# Altium footprint library Connectors.PcbLib: 46 footprints (part 2 of 3)
Each footprint in its own frame and in the unit in brackets; x right, y up, seen from the top. Pads: shape width x height; smd on the part's side, far side on the other; paste and mask are expansions set on the pad; w line width, h text height; cw(c..) or ccw(c..) is an arc to the next point about the centre after c.
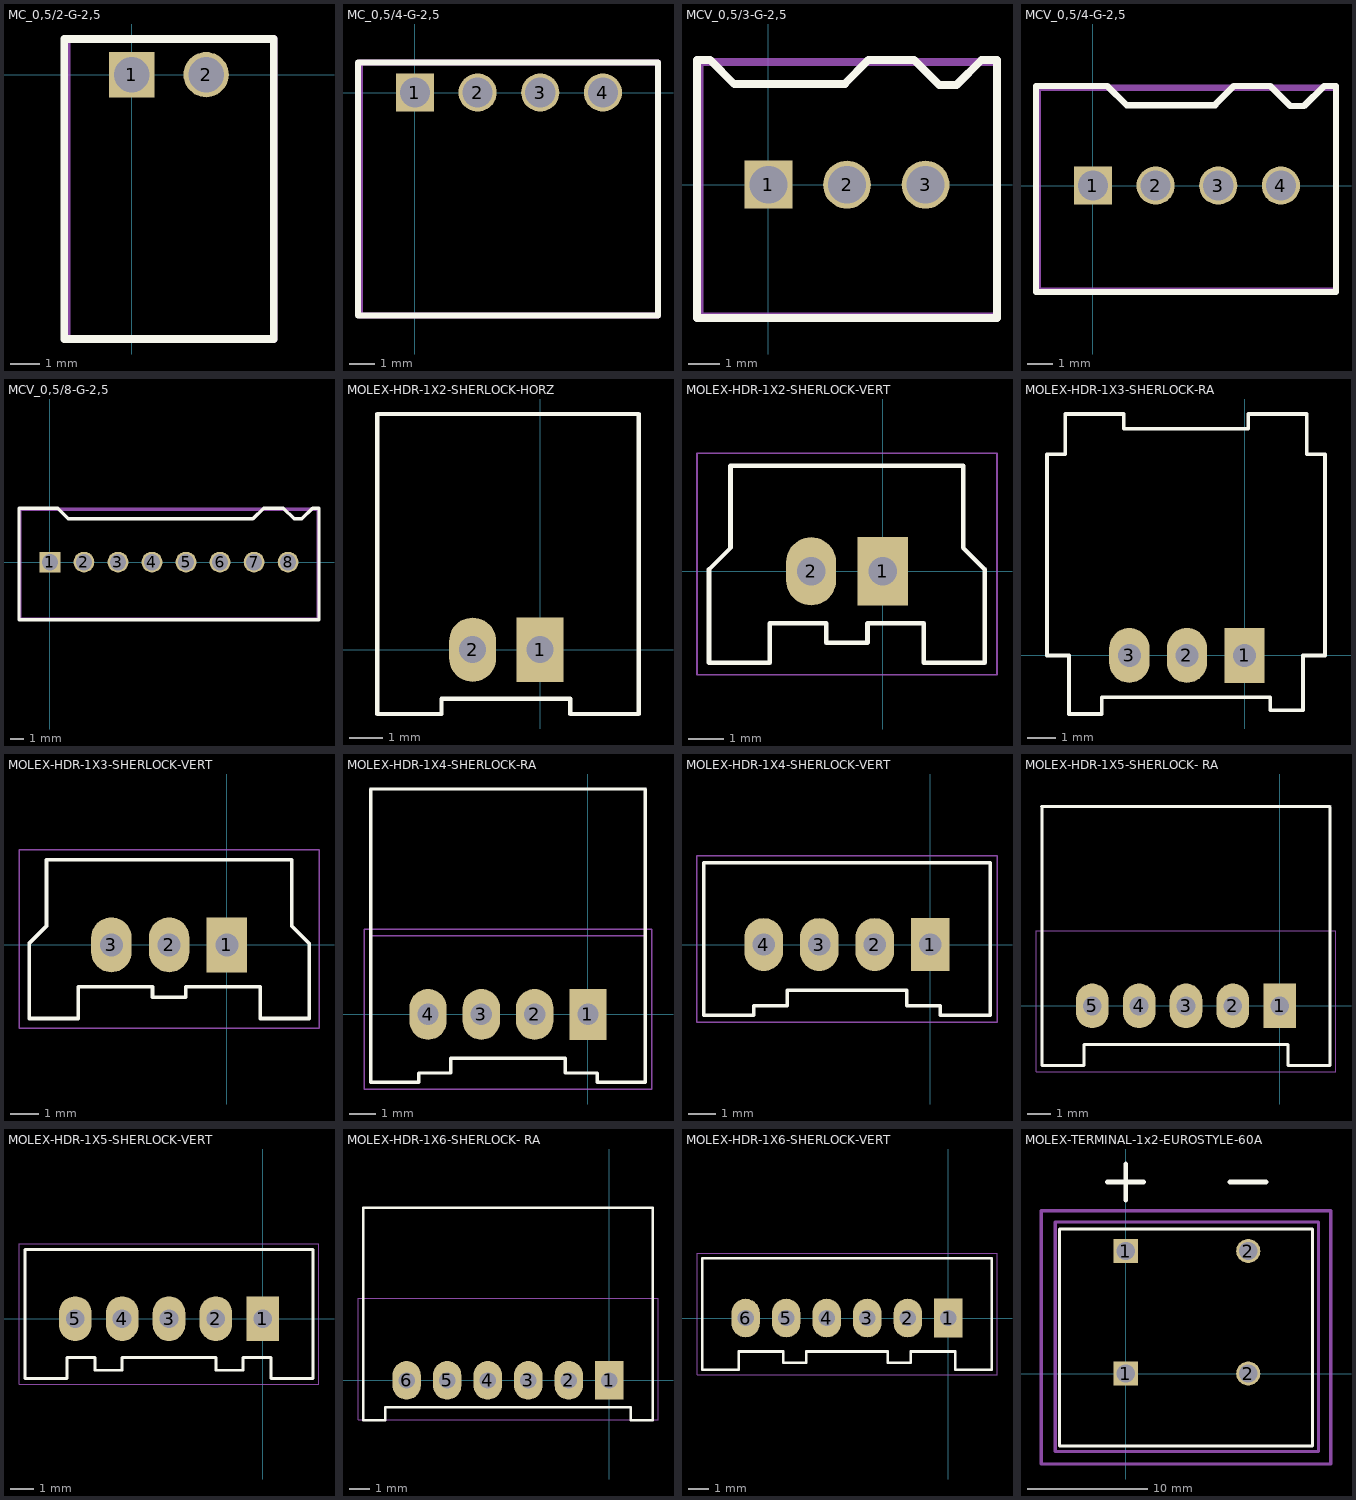
[diagram p1: the footprints below, top view; thin cyan lines are the x and y axes]

## MC_0,5/2-G-2,5 [mil] "CONN TERM BLOCK 2.50MM 2POS RIGHT ANGLE"
pads (2):
  rect 60x60 hole 47.24: 1(0,0)
  round 60 hole 47.24: 2(98.43,0)
Top Overlay:
  lines w10: -89.57,-350.39 187.99,-350.39 187.99,47.24 -89.57,47.24 -89.57,-350.39
Mechanical 13:
  lines w10: -86.61,-350.39 187.99,-350.39 187.99,47.24 -86.61,47.24 -86.61,-350.39
Mechanical 15:
  lines w10: -86.61,-350.39 -86.61,47.24 187.99,47.24 187.99,-350.39 -86.61,-350.39
3D body "1881448_00.stp": height 318.9, standoff -137.8, extent -87,-349.82 184.65,47.82

## MC_0,5/4-G-2,5 [mil] "CONN TERM BLOCK 2.50MM 4POS RIGHT ANGLE"
pads (4):
  rect 60x60 hole 47.24: 1(0,0)
  round 60 hole 47.24: 2(98.43,0) 3(196.85,0) 4(295.27,0)
Top Overlay:
  lines w10: -89.57,-350.39 -89.57,47.24 381.89,47.24 381.89,-350.39 -89.57,-350.39
Mechanical 13:
  lines w10: -86.61,-350.39 -86.61,47.24 381.89,47.24 381.89,-350.39 -86.61,-350.39
Mechanical 15:
  lines w10: -86.61,-350.39 381.89,-350.39 381.89,47.24 -86.61,47.24 -86.61,-350.39
3D body "1881464.stp": height 137.8, standoff -318.9, extent -87.25,-349.64 381.25,48

## MCV_0,5/3-G-2,5 [mil] "CONN TERM BLOCK 2.50MM 3POS"
pads (3):
  rect 60x60 hole 47.24: 1(0,0)
  round 60 hole 47.24: 2(98.43,0) 3(196.85,0)
Top Overlay:
  lines w10: 94.94,125.98 125.46,156.5 182.54,156.5 214.04,125 235.69,125 267.19,156.5 285.89,156.5 ; 95.93,125.98 -42.85,125.98 -73.36,156.5 -89.57,156.5 -89.57,-167.32 286.42,-167.32 286.42,156.5
Mechanical 13:
  lines w10: -86.61,-165.35 -86.61,153.54 286.42,153.54 286.42,-165.35 -86.61,-165.35
Mechanical 15:
  lines w10: 286.42,-165.35 -86.61,-165.35 -86.61,153.54 286.42,153.54 ; 286.42,-164.37 286.42,154.53
3D body "1881561.stp": height 397.64, standoff -137.8, extent -87.04,-165 283.04,153.9

## MCV_0,5/4-G-2,5 [mil] "CONN TERM BLOCK 2.50MM 4POS"
pads (4):
  rect 60x60 hole 47.24: 1(0,0)
  round 60 hole 47.24: 2(98.43,0) 3(196.85,0) 4(295.28,0)
Top Overlay:
  lines w10: 190.94,125.98 221.46,156.5 278.54,156.5 310.04,125 331.69,125 363.19,156.5 381.89,156.5 381.89,-167.32 -89.57,-167.32 -89.57,156.5 22.64,156.5 53.15,125.98 191.93,125.98
Mechanical 13:
  lines w10: -86.61,-165.35 381.89,-165.35 381.89,153.54 -86.61,153.54 -86.61,-165.35
Mechanical 15:
  lines w10: 381.89,-165.35 -86.61,-165.35 -86.61,153.54 381.89,153.54 ; 381.89,-164.37 381.89,154.53
3D body "1881574.stp": height 397.64, standoff -137.8, extent -86.61,-165.35 381.89,153.54

## MCV_0,5/8-G-2,5 [mil] "CONN TERM BLOCK 2.50MM 8POS"
pads (8):
  rect 60x60 hole 47.24: 1(0,0)
  round 60 hole 47.24: 2(98.43,0) 3(196.85,0) 4(295.28,0) 5(393.7,0) 6(492.13,0) 7(590.55,0) 8(688.98,0)
Top Overlay:
  lines w10: -89.57,-167.32 -89.57,156.5 22.64,156.5 53.15,125.98 587.6,125.98 618.11,156.5 675.2,156.5 706.69,125 728.35,125 759.84,156.5 778.54,156.5 778.54,-167.32 -89.57,-167.32
Mechanical 13:
  lines w10: -86.61,-165.35 -86.61,153.54 775.59,153.54 775.59,-165.35 -86.61,-165.35
Mechanical 15:
  lines w10: -86.61,-165.35 775.59,-165.35 775.59,153.54 -86.61,153.54 -86.61,-165.35
3D body "1881613.stp": height 397.64, standoff -137.8, extent -86.61,-165.35 775.59,153.54

## MOLEX-HDR-1X2-SHERLOCK-HORZ [mm]
height 8.5
pads (2):
  rect 1.397x1.905 hole 0.8: 1(0,0)
  oval 1.397x1.905 hole 0.8: 2(-2,0)
Top Overlay:
  lines w0.127: -4.826,-1.905 -2.921,-1.905 -2.921,-1.45 -1.575,-1.45 -0.425,-1.45 0.889,-1.45 0.889,-1.905 2.921,-1.905 2.921,-0.021 2.921,6.985 -4.826,6.985 -4.826,0.074 -4.826,-1.905
3D body "353630260.stp": height 5.54, standoff -3.16, extent -4.826,-1.905 2.874,8.595

## MOLEX-HDR-1X2-SHERLOCK-VERT [mm]
height 8.5
pads (2):
  rect 1.397x1.905 hole 0.8: 1(0,0)
  oval 1.397x1.905 hole 0.8: 2(-2,0)
Top Overlay:
  lines w0.127: -4.85,-2.55 -3.15,-2.55 -3.15,-1.45 -1.575,-1.45 -1.575,-1.99 -0.425,-1.99 -0.425,-1.45 1.15,-1.45 1.15,-2.55 2.85,-2.55 2.85,0.05 2.25,0.65 2.25,2.95 -4.25,2.95 -4.25,0.65 -4.85,0.05 -4.85,-2.55
Mechanical 13:
  lines w0.05: -4.85,-2.55 -4.85,0.05 -4.25,0.65 -4.25,2.95 2.25,2.95 2.25,0.65 2.85,0.05 2.85,-2.55 1.15,-2.55 1.15,-1.45 -0.425,-1.45 -0.425,-1.99 -1.575,-1.99 -1.575,-1.45 -3.15,-1.45 -3.15,-2.55 -4.85,-2.55
Mechanical 15:
  lines w0.05: -5.185,-2.89 -5.185,3.295 3.19,3.295 3.19,-2.89 -5.185,-2.89
3D body "molex-sherlock-2v-353620250.stp": height 8.5, standoff -3.3, extent -4.866,-2.591 2.834,2.959

## MOLEX-HDR-1X3-SHERLOCK-RA [mm]
height 8.5
pads (3):
  rect 1.397x1.905 hole 0.8: 1(0,0)
  oval 1.397x1.905 hole 0.8: 2(-2,0) 3(-4,0)
Top Overlay:
  lines w0.127: -6.858,0 -6.858,6.985 -6.223,6.985 -6.223,8.382 -4.191,8.382 -4.191,7.874 0.127,7.874 0.127,8.382 2.159,8.382 2.159,6.985 2.794,6.985 2.794,0 2.032,0 2.032,-1.905 0.889,-1.905 0.889,-1.45 -1.425,-1.45 -2.575,-1.45 -4.953,-1.45 -4.953,-2.032 -6.096,-2.032 -6.096,0 -6.858,0
3D body "353630360.stp": height 5.75, standoff -2.95, extent -6.882,-1.991 2.818,8.509

## MOLEX-HDR-1X3-SHERLOCK-VERT [mm]
height 8.5
pads (3):
  rect 1.397x1.905 hole 0.8: 1(0,0)
  oval 1.397x1.905 hole 0.8: 2(-2,0) 3(-4,0)
Top Overlay:
  lines w0.127: -6.85,-2.55 -6.85,0.05 -6.25,0.65 -6.25,2.95 2.25,2.95 2.25,0.65 2.85,0.05 2.85,-2.55 1.15,-2.55 1.15,-1.45 -1.425,-1.45 -1.425,-1.82 -2.575,-1.82 -2.575,-1.45 -5.15,-1.45 -5.15,-2.55 -6.85,-2.55
Mechanical 13:
  lines w0.05: -6.85,-2.55 -5.15,-2.55 -5.15,-1.45 -2.575,-1.45 -2.575,-1.82 -1.425,-1.82 -1.425,-1.45 1.15,-1.45 1.15,-2.55 2.85,-2.55 2.85,0.05 2.25,0.65 2.25,2.95 -6.25,2.95 -6.25,0.65 -6.85,0.05 -6.85,-2.55
Mechanical 15:
  lines w0.05: -7.2,-2.89 -7.2,3.295 3.19,3.295 3.19,-2.89 -7.2,-2.89
3D body "353620350.stp": height 8.57, standoff -3.23, extent -6.882,-2.565 2.818,2.985

## MOLEX-HDR-1X4-SHERLOCK-RA [mm]
height 8.5
pads (4):
  rect 1.397x1.905 hole 0.8: 1(0,0)
  oval 1.397x1.905 hole 0.8: 2(-2,0) 3(-4,0) 4(-6,0)
Top Overlay:
  lines w0.127: -8.15,-2.55 -8.15,2.95 -8.15,8.455 -8.147,8.458 2.141,8.458 2.15,8.449 2.15,2.95 2.15,-2.55 0.35,-2.55 0.35,-2.2 -0.85,-2.2 -0.85,-1.65 -5.15,-1.65 -5.15,-2.2 -6.35,-2.2 -6.35,-2.55 -8.15,-2.55
Mechanical 13:
  lines w0.05: -8.15,-2.55 -6.35,-2.55 -6.35,-2.2 -5.15,-2.2 -5.15,-1.65 -0.85,-1.65 -0.85,-2.2 0.35,-2.2 0.35,-2.55 2.15,-2.55 2.15,2.95 -8.15,2.95 -8.15,-2.55
Mechanical 15:
  lines w0.05: -8.4,-2.8 2.4,-2.8 2.4,3.2 -8.4,3.2 -8.4,-2.8
3D body "353630460.stp": height 5.54, standoff -3.16, extent -8.173,-1.981 2.127,8.519

## MOLEX-HDR-1X4-SHERLOCK-VERT [mm]
height 8.5
pads (4):
  rect 1.397x1.905 hole 0.8: 1(0,0)
  oval 1.397x1.905 hole 0.8: 2(-2,0) 3(-4,0) 4(-6,0)
Top Overlay:
  lines w0.127: -8.15,-2.55 -8.15,2.95 2.15,2.95 2.15,-2.55 0.35,-2.55 0.35,-2.2 -0.85,-2.2 -0.85,-1.65 -5.15,-1.65 -5.15,-2.2 -6.35,-2.2 -6.35,-2.55 -8.15,-2.55
Mechanical 13:
  lines w0.05: -8.15,-2.55 -6.35,-2.55 -6.35,-2.2 -5.15,-2.2 -5.15,-1.65 -0.85,-1.65 -0.85,-2.2 0.35,-2.2 0.35,-2.55 2.15,-2.55 2.15,2.95 -8.15,2.95 -8.15,-2.55
Mechanical 15:
  lines w0.05: -8.4,-2.8 2.4,-2.8 2.4,3.2 -8.4,3.2 -8.4,-2.8
3D body "molex-sherlock-4v-353620450.stp": height 8.5, standoff -3.3, extent -8.128,-2.565 2.172,2.985

## MOLEX-HDR-1X5-SHERLOCK- RA [mm]
height 8.5
pads (5):
  rect 1.397x1.905 hole 0.8: 1(0,0)
  oval 1.397x1.905 hole 0.8: 2(-2,0) 3(-4,0) 4(-6,0) 5(-8,0)
Top Overlay:
  lines w0.127: -10.15,2.642 -10.15,8.499 -10.16,8.509 2.134,8.509 2.15,8.493 2.15,2.95 2.15,-2.55 0.35,-2.55 0.35,-1.65 ; -10.15,2.95 -10.15,-2.55 -8.35,-2.55 -8.35,-1.65 -7.15,-1.65 0.35,-1.65 ; -6,-1.65 -2,-1.65 ; -0.85,-1.65 0.35,-1.65
Mechanical 13:
  lines w0.05: -10.15,2.95 -10.15,-2.55 -8.35,-2.55 -8.35,-1.65 -7.15,-1.65 ; -6,-1.65 -2,-1.65 ; -0.85,-1.65 0.35,-1.65 0.35,-2.55 2.15,-2.55 2.15,2.95
Mechanical 15:
  lines w0.05: -10.4,-2.8 -10.4,3.2 2.4,3.2 2.4,-2.8 -10.4,-2.8
3D body "353630560.stp": height 5.54, standoff -3.16, extent -10.16,-1.956 2.14,8.544

## MOLEX-HDR-1X5-SHERLOCK-VERT [mm]
height 8.5
pads (5):
  rect 1.397x1.905 hole 0.8: 1(0,0)
  oval 1.397x1.905 hole 0.8: 2(-2,0) 3(-4,0) 4(-6,0) 5(-8,0)
Top Overlay:
  lines w0.127: -10.15,-2.55 -8.35,-2.55 -8.35,-1.65 -7.15,-1.65 -7.15,-2.2 -6,-2.2 -6,-1.65 -2,-1.65 -2,-2.2 -0.85,-2.2 -0.85,-1.65 0.35,-1.65 0.35,-2.55 2.15,-2.55 2.15,2.95 -10.15,2.95 -10.15,-2.55
Mechanical 13:
  lines w0.05: -10.15,-2.55 -10.15,2.95 2.15,2.95 2.15,-2.55 0.35,-2.55 0.35,-1.65 -0.85,-1.65 -0.85,-2.2 -2,-2.2 -2,-1.65 -6,-1.65 -6,-2.2 -7.15,-2.2 -7.15,-1.65 -8.35,-1.65 -8.35,-2.55 -10.15,-2.55
Mechanical 15:
  lines w0.05: -10.4,-2.8 -10.4,3.2 2.4,3.2 2.4,-2.8 -10.4,-2.8
3D body "molex-sherlock-5v-353620550.stp": height 8.5, standoff -3.3, extent -10.16,-2.565 2.14,2.985

## MOLEX-HDR-1X6-SHERLOCK- RA [mm]
height 8.5
pads (6):
  rect 1.397x1.905 hole 0.8: 1(0,0)
  oval 1.397x1.905 hole 0.8: 2(-2,0) 3(-4,0) 4(-6,0) 5(-8,0) 6(-10,0)
Top Overlay:
  lines w0.127: -12.15,2.642 -12.15,8.499 ; -12.15,2.95 -12.15,-1.975 -11.05,-1.975 -11.05,-1.325 1.05,-1.325 1.05,-1.975 2.15,-1.975 2.15,2.95 2.15,8.493 2.134,8.509 -12.15,8.509
Mechanical 13:
  lines w0.05: -12.15,8.525 -12.15,-1.975 -11.05,-1.975 -11.05,-1.325 -2,-1.325 1.05,-1.325 1.05,-1.975 2.15,-1.975 2.15,8.525
  lines w0.051: -12.15,8.525 2.15,8.525
Mechanical 15:
  lines w0.05: -12.4,-1.95 2.4,-1.95 2.4,4.05 -12.4,4.05 -12.4,-1.95
3D body "353630660.stp": height 5.54, standoff -3.16, extent -12.15,-1.95 2.15,8.55

## MOLEX-HDR-1X6-SHERLOCK-VERT [mm]
height 8.5
pads (6):
  rect 1.397x1.905 hole 0.8: 1(0,0)
  oval 1.397x1.905 hole 0.8: 2(-2,0) 3(-4,0) 4(-6,0) 5(-8,0) 6(-10,0)
Top Overlay:
  lines w0.127: -12.15,-2.55 -12.15,2.95 2.15,2.95 2.15,-2.55 0.35,-2.55 0.35,-1.65 -1.85,-1.65 -1.85,-2.2 -3,-2.2 -3,-1.65 -7,-1.65 -7,-2.2 -8.15,-2.2 -8.15,-1.65 -10.35,-1.65 -10.35,-2.55 -12.15,-2.55
Mechanical 13:
  lines w0.05: -12.15,-2.55 -12.15,2.95 2.15,2.95 2.15,-2.55 0.35,-2.55 0.35,-1.65 -1.85,-1.65 -1.85,-2.2 -3,-2.2 -3,-1.65 -7,-1.65 -7,-2.2 -8.15,-2.2 -8.15,-1.65 -10.35,-1.65 -10.35,-2.55 -12.15,-2.55
Mechanical 15:
  lines w0.05: -12.4,-2.8 -12.4,3.2 2.4,3.2 2.4,-2.8 -12.4,-2.8
3D body "molex-sherlock-6v-353620650.stp": height 8.5, standoff -3.3, extent -12.167,-2.616 2.133,2.934

## MOLEX-TERMINAL-1x2-EUROSTYLE-60A [mm]
height 29.7
pads (4):
  rect 2x2 hole 1.52: 1(0,0) 1(0,10.16)
  round 2 hole 1.52: 2(10.16,0) 2(10.16,10.16)
Top Overlay:
  lines w0.254: -5.5,-6 -5.5,12 15.5,12 15.5,-6 -5.5,-6
  lines w0.4: -1.5,15.875 1.5,15.875 ; 0,14.375 0,17.375 ; 8.66,15.875 11.66,15.875
Mechanical 13:
  lines w0.254: -5.84,-6.45 16,-6.45 16,12.55 -5.84,12.55 -5.84,-6.45
Mechanical 15:
  lines w0.254: -7,-7.5 -7,13.5 17,13.5 17,-7.5 -7,-7.5
3D body "399700102.stp": height 29.72, standoff -3.68, extent -5.947,-6.443 15.897,12.353